# Altium schematic symbol library jlcpcb_2025_04_capacitors_extended_0603.schlib: 3668 symbols (part 19 of 20)
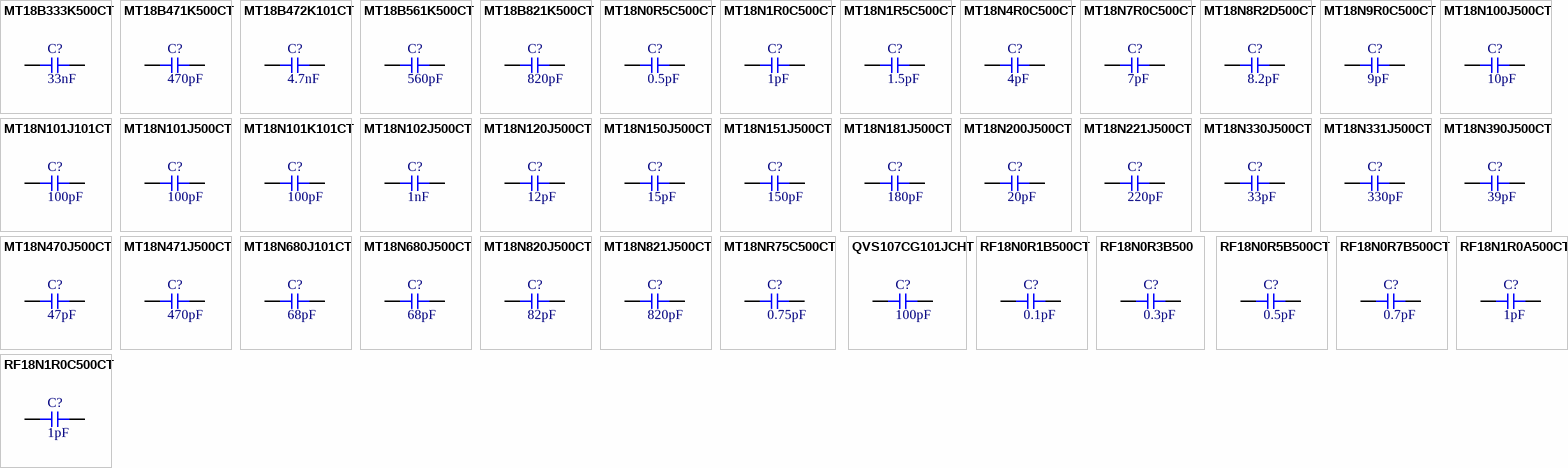
[diagram p109: symbols MT18B333K500CT to RF18N1R0C500CT]

## MT18N0R5C500CT
designator C?  Capacitance: 0.5pF  (hidden comment: *)
Capacitor, Ceramic (MLCC), 0.5pF, 50V, NP0, SMD 0603; Manufacturer: Walsin Tech Corp; Manufacturer Part Number: MT18N0R5C500CT; Package Size: 0603; JLCPCB Basic Part: No; JLCPCB Part Number: C908514; Supplier 1: LCSC; Category: Capacitors - MLCC; Supplier Part Number 1: C908514; Voltage Rating: 50V; Temperature Coefficient: NP0; RoHS: Yes; ComponentLink1Description: Datasheet; ComponentLink1URL: https://wmsc.lcsc.com/wmsc/upload/file/pdf/v2/lcsc/2304140030_Walsin-Tech-Corp-MT18N0R5C500CT_C908514.pdf; ComponentLink2Description: JLCPCB Part URL; ComponentLink2URL: https://jlcpcb.com/partdetail/C908514; ComponentLink3Description: LCSC Part URL; ComponentLink3URL: https://lcsc.com/product-detail/Multilayer-Ceramic-Capacitors-MLCC---SMD-SMT_Walsin-Tech-Corp-Walsin-Tech-Corp-MT18N0R5C500CT_C908514.html
footprint CAP-0603 (0603 (1608M) Capacitor)
pins: 1, 2

## MT18N1R0C500CT
designator C?  Capacitance: 1pF  (hidden comment: *)
Capacitor, Ceramic (MLCC), 1pF, 50V, NP0, SMD 0603; Manufacturer: Walsin Tech Corp; Manufacturer Part Number: MT18N1R0C500CT; Package Size: 0603; JLCPCB Basic Part: No; JLCPCB Part Number: C335541; Supplier 1: LCSC; Category: Capacitors - MLCC; Supplier Part Number 1: C335541; Voltage Rating: 50V; Temperature Coefficient: NP0; RoHS: Yes; ComponentLink1Description: Datasheet; ComponentLink1URL: https://wmsc.lcsc.com/wmsc/upload/file/pdf/v2/lcsc/2304140030_Walsin-Tech-Corp-MT18N1R0C500CT_C335541.pdf; ComponentLink2Description: JLCPCB Part URL; ComponentLink2URL: https://jlcpcb.com/partdetail/C335541; ComponentLink3Description: LCSC Part URL; ComponentLink3URL: https://lcsc.com/product-detail/Multilayer-Ceramic-Capacitors-MLCC---SMD-SMT_Walsin-Tech-Corp-Walsin-Tech-Corp-MT18N1R0C500CT_C335541.html
footprint CAP-0603 (0603 (1608M) Capacitor)
pins: 1, 2

## MT18N1R5C500CT
designator C?  Capacitance: 1.5pF  (hidden comment: *)
Capacitor, Ceramic (MLCC), 1.5pF, 50V, NP0, SMD 0603; Manufacturer: Walsin Tech Corp; Manufacturer Part Number: MT18N1R5C500CT; Package Size: 0603; JLCPCB Basic Part: No; JLCPCB Part Number: C908503; Supplier 1: LCSC; Category: Capacitors - MLCC; Supplier Part Number 1: C908503; Voltage Rating: 50V; Temperature Coefficient: NP0; RoHS: Yes; ComponentLink1Description: Datasheet; ComponentLink1URL: https://wmsc.lcsc.com/wmsc/upload/file/pdf/v2/lcsc/2304140030_Walsin-Tech-Corp-MT18N1R5C500CT_C908503.pdf; ComponentLink2Description: JLCPCB Part URL; ComponentLink2URL: https://jlcpcb.com/partdetail/C908503; ComponentLink3Description: LCSC Part URL; ComponentLink3URL: https://lcsc.com/product-detail/Multilayer-Ceramic-Capacitors-MLCC---SMD-SMT_Walsin-Tech-Corp-Walsin-Tech-Corp-MT18N1R5C500CT_C908503.html
footprint CAP-0603 (0603 (1608M) Capacitor)
pins: 1, 2

## MT18N4R0C500CT
designator C?  Capacitance: 4pF  (hidden comment: *)
Capacitor, Ceramic (MLCC), 4pF, 50V, NP0, SMD 0603; Manufacturer: Walsin Tech Corp; Manufacturer Part Number: MT18N4R0C500CT; Package Size: 0603; JLCPCB Basic Part: No; JLCPCB Part Number: C908501; Supplier 1: LCSC; Category: Capacitors - MLCC; Supplier Part Number 1: C908501; Voltage Rating: 50V; Temperature Coefficient: NP0; RoHS: Yes; ComponentLink1Description: Datasheet; ComponentLink1URL: https://wmsc.lcsc.com/wmsc/upload/file/pdf/v2/lcsc/2304140030_Walsin-Tech-Corp-MT18N4R0C500CT_C908501.pdf; ComponentLink2Description: JLCPCB Part URL; ComponentLink2URL: https://jlcpcb.com/partdetail/C908501; ComponentLink3Description: LCSC Part URL; ComponentLink3URL: https://lcsc.com/product-detail/Multilayer-Ceramic-Capacitors-MLCC---SMD-SMT_Walsin-Tech-Corp-Walsin-Tech-Corp-MT18N4R0C500CT_C908501.html
footprint CAP-0603 (0603 (1608M) Capacitor)
pins: 1, 2

## MT18N7R0C500CT
designator C?  Capacitance: 7pF  (hidden comment: *)
Capacitor, Ceramic (MLCC), 7pF, 50V, NP0, SMD 0603; Manufacturer: Walsin Tech Corp; Manufacturer Part Number: MT18N7R0C500CT; Package Size: 0603; JLCPCB Basic Part: No; JLCPCB Part Number: C908549; Supplier 1: LCSC; Category: Capacitors - MLCC; Supplier Part Number 1: C908549; Voltage Rating: 50V; Temperature Coefficient: NP0; RoHS: Yes; ComponentLink1Description: Datasheet; ComponentLink1URL: https://wmsc.lcsc.com/wmsc/upload/file/pdf/v2/lcsc/2304140030_Walsin-Tech-Corp-MT18N7R0C500CT_C908549.pdf; ComponentLink2Description: JLCPCB Part URL; ComponentLink2URL: https://jlcpcb.com/partdetail/C908549; ComponentLink3Description: LCSC Part URL; ComponentLink3URL: https://lcsc.com/product-detail/Multilayer-Ceramic-Capacitors-MLCC---SMD-SMT_Walsin-Tech-Corp-Walsin-Tech-Corp-MT18N7R0C500CT_C908549.html
footprint CAP-0603 (0603 (1608M) Capacitor)
pins: 1, 2

## MT18N8R2D500CT
designator C?  Capacitance: 8.2pF  (hidden comment: *)
Capacitor, Ceramic (MLCC), 8.2pF, 50V, NP0, SMD 0603; Manufacturer: Walsin Tech Corp; Manufacturer Part Number: MT18N8R2D500CT; Package Size: 0603; JLCPCB Basic Part: No; JLCPCB Part Number: C458972; Supplier 1: LCSC; Category: Capacitors - MLCC; Supplier Part Number 1: C458972; Voltage Rating: 50V; Temperature Coefficient: NP0; RoHS: Yes; ComponentLink1Description: Datasheet; ComponentLink1URL: https://wmsc.lcsc.com/wmsc/upload/file/pdf/v2/lcsc/2304140030_Walsin-Tech-Corp-MT18N8R2D500CT_C458972.pdf; ComponentLink2Description: JLCPCB Part URL; ComponentLink2URL: https://jlcpcb.com/partdetail/C458972; ComponentLink3Description: LCSC Part URL; ComponentLink3URL: https://lcsc.com/product-detail/Multilayer-Ceramic-Capacitors-MLCC---SMD-SMT_Walsin-Tech-Corp-Walsin-Tech-Corp-MT18N8R2D500CT_C458972.html
footprint CAP-0603 (0603 (1608M) Capacitor)
pins: 1, 2

## MT18N9R0C500CT
designator C?  Capacitance: 9pF  (hidden comment: *)
Capacitor, Ceramic (MLCC), 9pF, 50V, NP0, SMD 0603; Manufacturer: Walsin Tech Corp; Manufacturer Part Number: MT18N9R0C500CT; Package Size: 0603; JLCPCB Basic Part: No; JLCPCB Part Number: C908550; Supplier 1: LCSC; Category: Capacitors - MLCC; Supplier Part Number 1: C908550; Voltage Rating: 50V; Temperature Coefficient: NP0; RoHS: Yes; ComponentLink1Description: Datasheet; ComponentLink1URL: https://wmsc.lcsc.com/wmsc/upload/file/pdf/v2/lcsc/2010271908_Walsin-Tech-Corp-MT18N9R0C500CT_C908550.pdf; ComponentLink2Description: JLCPCB Part URL; ComponentLink2URL: https://jlcpcb.com/partdetail/C908550; ComponentLink3Description: LCSC Part URL; ComponentLink3URL: https://lcsc.com/product-detail/Multilayer-Ceramic-Capacitors-MLCC---SMD-SMT_Walsin-Tech-Corp-Walsin-Tech-Corp-MT18N9R0C500CT_C908550.html
footprint CAP-0603 (0603 (1608M) Capacitor)
pins: 1, 2

## MT18N100J500CT
designator C?  Capacitance: 10pF  (hidden comment: *)
Capacitor, Ceramic (MLCC), 10pF, ±5%, 50V, NP0, ±5%, SMD 0603; Manufacturer: Walsin Tech Corp; Manufacturer Part Number: MT18N100J500CT; Package Size: 0603; JLCPCB Basic Part: No; JLCPCB Part Number: C431817; Supplier 1: LCSC; Category: Capacitors - MLCC; Supplier Part Number 1: C431817; Tolerance: ±5%; Voltage Rating: 50V; Temperature Coefficient: NP0; RoHS: Yes; ComponentLink1Description: Datasheet; ComponentLink1URL: https://wmsc.lcsc.com/wmsc/upload/file/pdf/v2/lcsc/2304140030_Walsin-Tech-Corp-MT18N100J500CT_C431817.pdf; ComponentLink2Description: JLCPCB Part URL; ComponentLink2URL: https://jlcpcb.com/partdetail/C431817; ComponentLink3Description: LCSC Part URL; ComponentLink3URL: https://lcsc.com/product-detail/Multilayer-Ceramic-Capacitors-MLCC---SMD-SMT_Walsin-Tech-Corp-Walsin-Tech-Corp-MT18N100J500CT_C431817.html
footprint CAP-0603 (0603 (1608M) Capacitor)
pins: 1, 2

## MT18N101J101CT
designator C?  Capacitance: 100pF  (hidden comment: *)
Capacitor, Ceramic (MLCC), 100pF, ±5%, 100V, NP0, ±5%, SMD 0603; Manufacturer: Walsin Tech Corp; Manufacturer Part Number: MT18N101J101CT; Package Size: 0603; JLCPCB Basic Part: No; JLCPCB Part Number: C323564; Supplier 1: LCSC; Category: Capacitors - MLCC; Supplier Part Number 1: C323564; Tolerance: ±5%; Voltage Rating: 100V; Temperature Coefficient: NP0; RoHS: Yes; ComponentLink1Description: Datasheet; ComponentLink1URL: https://wmsc.lcsc.com/wmsc/upload/file/pdf/v2/lcsc/2304140030_Walsin-Tech-Corp-MT18N101J101CT_C323564.pdf; ComponentLink2Description: JLCPCB Part URL; ComponentLink2URL: https://jlcpcb.com/partdetail/C323564; ComponentLink3Description: LCSC Part URL; ComponentLink3URL: https://lcsc.com/product-detail/Multilayer-Ceramic-Capacitors-MLCC---SMD-SMT_Walsin-Tech-Corp-Walsin-Tech-Corp-MT18N101J101CT_C323564.html
footprint CAP-0603 (0603 (1608M) Capacitor)
pins: 1, 2

## MT18N101J500CT
designator C?  Capacitance: 100pF  (hidden comment: *)
Capacitor, Ceramic (MLCC), 100pF, ±5%, 50V, NP0, ±5%, SMD 0603; Manufacturer: Walsin Tech Corp; Manufacturer Part Number: MT18N101J500CT; Package Size: 0603; JLCPCB Basic Part: No; JLCPCB Part Number: C323563; Supplier 1: LCSC; Category: Capacitors - MLCC; Supplier Part Number 1: C323563; Tolerance: ±5%; Voltage Rating: 50V; Temperature Coefficient: NP0; RoHS: Yes; ComponentLink1Description: Datasheet; ComponentLink1URL: https://wmsc.lcsc.com/wmsc/upload/file/pdf/v2/lcsc/2304140030_Walsin-Tech-Corp-MT18N101J500CT_C323563.pdf; ComponentLink2Description: JLCPCB Part URL; ComponentLink2URL: https://jlcpcb.com/partdetail/C323563; ComponentLink3Description: LCSC Part URL; ComponentLink3URL: https://lcsc.com/product-detail/Multilayer-Ceramic-Capacitors-MLCC---SMD-SMT_Walsin-Tech-Corp-Walsin-Tech-Corp-MT18N101J500CT_C323563.html
footprint CAP-0603 (0603 (1608M) Capacitor)
pins: 1, 2

## MT18N101K101CT
designator C?  Capacitance: 100pF  (hidden comment: *)
Capacitor, Ceramic (MLCC), 100pF, NP0, SMD 0603; Manufacturer: Walsin Tech Corp; Manufacturer Part Number: MT18N101K101CT; Package Size: 0603; JLCPCB Basic Part: No; JLCPCB Part Number: C4354964; Supplier 1: LCSC; Category: Capacitors - MLCC; Supplier Part Number 1: C4354964; Temperature Coefficient: NP0; RoHS: Yes; ComponentLink1Description: Datasheet; ComponentLink1URL: https://wmsc.lcsc.com/wmsc/upload/file/pdf/v2/lcsc/2207131800_Walsin-Tech-Corp-MT18N101K101CT_C4354964.pdf; ComponentLink2Description: JLCPCB Part URL; ComponentLink2URL: https://jlcpcb.com/partdetail/C4354964; ComponentLink3Description: LCSC Part URL; ComponentLink3URL: https://lcsc.com/product-detail/Multilayer-Ceramic-Capacitors-MLCC---SMD-SMT_Walsin-Tech-Corp-Walsin-Tech-Corp-MT18N101K101CT_C4354964.html
footprint CAP-0603 (0603 (1608M) Capacitor)
pins: 1, 2

## MT18N102J500CT
designator C?  Capacitance: 1nF  (hidden comment: *)
Capacitor, Ceramic (MLCC), 1nF, ±5%, 50V, NP0, ±5%, SMD 0603; Manufacturer: Walsin Tech Corp; Manufacturer Part Number: MT18N102J500CT; Package Size: 0603; JLCPCB Basic Part: No; JLCPCB Part Number: C458965; Supplier 1: LCSC; Category: Capacitors - MLCC; Supplier Part Number 1: C458965; Tolerance: ±5%; Voltage Rating: 50V; Temperature Coefficient: NP0; RoHS: Yes; ComponentLink1Description: Datasheet; ComponentLink1URL: https://wmsc.lcsc.com/wmsc/upload/file/pdf/v2/lcsc/2304140030_Walsin-Tech-Corp-MT18N102J500CT_C458965.pdf; ComponentLink2Description: JLCPCB Part URL; ComponentLink2URL: https://jlcpcb.com/partdetail/C458965; ComponentLink3Description: LCSC Part URL; ComponentLink3URL: https://lcsc.com/product-detail/Multilayer-Ceramic-Capacitors-MLCC---SMD-SMT_Walsin-Tech-Corp-Walsin-Tech-Corp-MT18N102J500CT_C458965.html
footprint CAP-0603 (0603 (1608M) Capacitor)
pins: 1, 2

## MT18N120J500CT
designator C?  Capacitance: 12pF  (hidden comment: *)
Capacitor, Ceramic (MLCC), 12pF, ±5%, 50V, NP0, ±5%, SMD 0603; Manufacturer: Walsin Tech Corp; Manufacturer Part Number: MT18N120J500CT; Package Size: 0603; JLCPCB Basic Part: No; JLCPCB Part Number: C335540; Supplier 1: LCSC; Category: Capacitors - MLCC; Supplier Part Number 1: C335540; Tolerance: ±5%; Voltage Rating: 50V; Temperature Coefficient: NP0; RoHS: Yes; ComponentLink1Description: Datasheet; ComponentLink1URL: https://wmsc.lcsc.com/wmsc/upload/file/pdf/v2/lcsc/2304140030_Walsin-Tech-Corp-MT18N120J500CT_C335540.pdf; ComponentLink2Description: JLCPCB Part URL; ComponentLink2URL: https://jlcpcb.com/partdetail/C335540; ComponentLink3Description: LCSC Part URL; ComponentLink3URL: https://lcsc.com/product-detail/Multilayer-Ceramic-Capacitors-MLCC---SMD-SMT_Walsin-Tech-Corp-Walsin-Tech-Corp-MT18N120J500CT_C335540.html
footprint CAP-0603 (0603 (1608M) Capacitor)
pins: 1, 2

## MT18N150J500CT
designator C?  Capacitance: 15pF  (hidden comment: *)
Capacitor, Ceramic (MLCC), 15pF, ±5%, 50V, NP0, ±5%, SMD 0603; Manufacturer: Walsin Tech Corp; Manufacturer Part Number: MT18N150J500CT; Package Size: 0603; JLCPCB Basic Part: No; JLCPCB Part Number: C323562; Supplier 1: LCSC; Category: Capacitors - MLCC; Supplier Part Number 1: C323562; Tolerance: ±5%; Voltage Rating: 50V; Temperature Coefficient: NP0; RoHS: Yes; ComponentLink1Description: Datasheet; ComponentLink1URL: https://wmsc.lcsc.com/wmsc/upload/file/pdf/v2/lcsc/2304140030_Walsin-Tech-Corp-MT18N150J500CT_C323562.pdf; ComponentLink2Description: JLCPCB Part URL; ComponentLink2URL: https://jlcpcb.com/partdetail/C323562; ComponentLink3Description: LCSC Part URL; ComponentLink3URL: https://lcsc.com/product-detail/Multilayer-Ceramic-Capacitors-MLCC---SMD-SMT_Walsin-Tech-Corp-Walsin-Tech-Corp-MT18N150J500CT_C323562.html
footprint CAP-0603 (0603 (1608M) Capacitor)
pins: 1, 2

## MT18N151J500CT
designator C?  Capacitance: 150pF  (hidden comment: *)
Capacitor, Ceramic (MLCC), 150pF, ±5%, 50V, NP0, ±5%, SMD 0603; Manufacturer: Walsin Tech Corp; Manufacturer Part Number: MT18N151J500CT; Package Size: 0603; JLCPCB Basic Part: No; JLCPCB Part Number: C323561; Supplier 1: LCSC; Category: Capacitors - MLCC; Supplier Part Number 1: C323561; Tolerance: ±5%; Voltage Rating: 50V; Temperature Coefficient: NP0; RoHS: Yes; ComponentLink1Description: Datasheet; ComponentLink1URL: https://wmsc.lcsc.com/wmsc/upload/file/pdf/v2/lcsc/2304140030_Walsin-Tech-Corp-MT18N151J500CT_C323561.pdf; ComponentLink2Description: JLCPCB Part URL; ComponentLink2URL: https://jlcpcb.com/partdetail/C323561; ComponentLink3Description: LCSC Part URL; ComponentLink3URL: https://lcsc.com/product-detail/Multilayer-Ceramic-Capacitors-MLCC---SMD-SMT_Walsin-Tech-Corp-Walsin-Tech-Corp-MT18N151J500CT_C323561.html
footprint CAP-0603 (0603 (1608M) Capacitor)
pins: 1, 2

## MT18N181J500CT
designator C?  Capacitance: 180pF  (hidden comment: *)
Capacitor, Ceramic (MLCC), 180pF, ±5%, 50V, NP0, ±5%, SMD 0603; Manufacturer: Walsin Tech Corp; Manufacturer Part Number: MT18N181J500CT; Package Size: 0603; JLCPCB Basic Part: No; JLCPCB Part Number: C458966; Supplier 1: LCSC; Category: Capacitors - MLCC; Supplier Part Number 1: C458966; Tolerance: ±5%; Voltage Rating: 50V; Temperature Coefficient: NP0; RoHS: Yes; ComponentLink1Description: Datasheet; ComponentLink1URL: https://wmsc.lcsc.com/wmsc/upload/file/pdf/v2/lcsc/2304140030_Walsin-Tech-Corp-MT18N181J500CT_C458966.pdf; ComponentLink2Description: JLCPCB Part URL; ComponentLink2URL: https://jlcpcb.com/partdetail/C458966; ComponentLink3Description: LCSC Part URL; ComponentLink3URL: https://lcsc.com/product-detail/Multilayer-Ceramic-Capacitors-MLCC---SMD-SMT_Walsin-Tech-Corp-Walsin-Tech-Corp-MT18N181J500CT_C458966.html
footprint CAP-0603 (0603 (1608M) Capacitor)
pins: 1, 2

## MT18N200J500CT
designator C?  Capacitance: 20pF  (hidden comment: *)
Capacitor, Ceramic (MLCC), 20pF, ±5%, 50V, NP0, ±5%, SMD 0603; Manufacturer: Walsin Tech Corp; Manufacturer Part Number: MT18N200J500CT; Package Size: 0603; JLCPCB Basic Part: No; JLCPCB Part Number: C458967; Supplier 1: LCSC; Category: Capacitors - MLCC; Supplier Part Number 1: C458967; Tolerance: ±5%; Voltage Rating: 50V; Temperature Coefficient: NP0; RoHS: Yes; ComponentLink1Description: Datasheet; ComponentLink1URL: https://wmsc.lcsc.com/wmsc/upload/file/pdf/v2/lcsc/2304140030_Walsin-Tech-Corp-MT18N200J500CT_C458967.pdf; ComponentLink2Description: JLCPCB Part URL; ComponentLink2URL: https://jlcpcb.com/partdetail/C458967; ComponentLink3Description: LCSC Part URL; ComponentLink3URL: https://lcsc.com/product-detail/Multilayer-Ceramic-Capacitors-MLCC---SMD-SMT_Walsin-Tech-Corp-Walsin-Tech-Corp-MT18N200J500CT_C458967.html
footprint CAP-0603 (0603 (1608M) Capacitor)
pins: 1, 2

## MT18N221J500CT
designator C?  Capacitance: 220pF  (hidden comment: *)
Capacitor, Ceramic (MLCC), 220pF, ±5%, 50V, NP0, ±5%, SMD 0603; Manufacturer: Walsin Tech Corp; Manufacturer Part Number: MT18N221J500CT; Package Size: 0603; JLCPCB Basic Part: No; JLCPCB Part Number: C458968; Supplier 1: LCSC; Category: Capacitors - MLCC; Supplier Part Number 1: C458968; Tolerance: ±5%; Voltage Rating: 50V; Temperature Coefficient: NP0; RoHS: Yes; ComponentLink1Description: Datasheet; ComponentLink1URL: https://wmsc.lcsc.com/wmsc/upload/file/pdf/v2/lcsc/2304140030_Walsin-Tech-Corp-MT18N221J500CT_C458968.pdf; ComponentLink2Description: JLCPCB Part URL; ComponentLink2URL: https://jlcpcb.com/partdetail/C458968; ComponentLink3Description: LCSC Part URL; ComponentLink3URL: https://lcsc.com/product-detail/Multilayer-Ceramic-Capacitors-MLCC---SMD-SMT_Walsin-Tech-Corp-Walsin-Tech-Corp-MT18N221J500CT_C458968.html
footprint CAP-0603 (0603 (1608M) Capacitor)
pins: 1, 2

## MT18N330J500CT
designator C?  Capacitance: 33pF  (hidden comment: *)
Capacitor, Ceramic (MLCC), 33pF, ±5%, 50V, NP0, ±5%, SMD 0603; Manufacturer: Walsin Tech Corp; Manufacturer Part Number: MT18N330J500CT; Package Size: 0603; JLCPCB Basic Part: No; JLCPCB Part Number: C323560; Supplier 1: LCSC; Category: Capacitors - MLCC; Supplier Part Number 1: C323560; Tolerance: ±5%; Voltage Rating: 50V; Temperature Coefficient: NP0; RoHS: Yes; ComponentLink1Description: Datasheet; ComponentLink1URL: https://wmsc.lcsc.com/wmsc/upload/file/pdf/v2/lcsc/2304140030_Walsin-Tech-Corp-MT18N330J500CT_C323560.pdf; ComponentLink2Description: JLCPCB Part URL; ComponentLink2URL: https://jlcpcb.com/partdetail/C323560; ComponentLink3Description: LCSC Part URL; ComponentLink3URL: https://lcsc.com/product-detail/Multilayer-Ceramic-Capacitors-MLCC---SMD-SMT_Walsin-Tech-Corp-Walsin-Tech-Corp-MT18N330J500CT_C323560.html
footprint CAP-0603 (0603 (1608M) Capacitor)
pins: 1, 2

## MT18N331J500CT
designator C?  Capacitance: 330pF  (hidden comment: *)
Capacitor, Ceramic (MLCC), 330pF, ±5%, 50V, NP0, ±5%, SMD 0603; Manufacturer: Walsin Tech Corp; Manufacturer Part Number: MT18N331J500CT; Package Size: 0603; JLCPCB Basic Part: No; JLCPCB Part Number: C335542; Supplier 1: LCSC; Category: Capacitors - MLCC; Supplier Part Number 1: C335542; Tolerance: ±5%; Voltage Rating: 50V; Temperature Coefficient: NP0; RoHS: Yes; ComponentLink1Description: Datasheet; ComponentLink1URL: https://wmsc.lcsc.com/wmsc/upload/file/pdf/v2/lcsc/2304140030_Walsin-Tech-Corp-MT18N331J500CT_C335542.pdf; ComponentLink2Description: JLCPCB Part URL; ComponentLink2URL: https://jlcpcb.com/partdetail/C335542; ComponentLink3Description: LCSC Part URL; ComponentLink3URL: https://lcsc.com/product-detail/Multilayer-Ceramic-Capacitors-MLCC---SMD-SMT_Walsin-Tech-Corp-Walsin-Tech-Corp-MT18N331J500CT_C335542.html
footprint CAP-0603 (0603 (1608M) Capacitor)
pins: 1, 2

## MT18N390J500CT
designator C?  Capacitance: 39pF  (hidden comment: *)
Capacitor, Ceramic (MLCC), 39pF, ±5%, 50V, NP0, ±5%, SMD 0603; Manufacturer: Walsin Tech Corp; Manufacturer Part Number: MT18N390J500CT; Package Size: 0603; JLCPCB Basic Part: No; JLCPCB Part Number: C908518; Supplier 1: LCSC; Category: Capacitors - MLCC; Supplier Part Number 1: C908518; Tolerance: ±5%; Voltage Rating: 50V; Temperature Coefficient: NP0; RoHS: Yes; ComponentLink1Description: Datasheet; ComponentLink1URL: https://wmsc.lcsc.com/wmsc/upload/file/pdf/v2/lcsc/2304140030_Walsin-Tech-Corp-MT18N390J500CT_C908518.pdf; ComponentLink2Description: JLCPCB Part URL; ComponentLink2URL: https://jlcpcb.com/partdetail/C908518; ComponentLink3Description: LCSC Part URL; ComponentLink3URL: https://lcsc.com/product-detail/Multilayer-Ceramic-Capacitors-MLCC---SMD-SMT_Walsin-Tech-Corp-Walsin-Tech-Corp-MT18N390J500CT_C908518.html
footprint CAP-0603 (0603 (1608M) Capacitor)
pins: 1, 2

## MT18N470J500CT
designator C?  Capacitance: 47pF  (hidden comment: *)
Capacitor, Ceramic (MLCC), 47pF, ±5%, 50V, NP0, ±5%, SMD 0603; Manufacturer: Walsin Tech Corp; Manufacturer Part Number: MT18N470J500CT; Package Size: 0603; JLCPCB Basic Part: No; JLCPCB Part Number: C323559; Supplier 1: LCSC; Category: Capacitors - MLCC; Supplier Part Number 1: C323559; Tolerance: ±5%; Voltage Rating: 50V; Temperature Coefficient: NP0; RoHS: Yes; ComponentLink1Description: Datasheet; ComponentLink1URL: https://wmsc.lcsc.com/wmsc/upload/file/pdf/v2/lcsc/2304140030_Walsin-Tech-Corp-MT18N470J500CT_C323559.pdf; ComponentLink2Description: JLCPCB Part URL; ComponentLink2URL: https://jlcpcb.com/partdetail/C323559; ComponentLink3Description: LCSC Part URL; ComponentLink3URL: https://lcsc.com/product-detail/Multilayer-Ceramic-Capacitors-MLCC---SMD-SMT_Walsin-Tech-Corp-Walsin-Tech-Corp-MT18N470J500CT_C323559.html
footprint CAP-0603 (0603 (1608M) Capacitor)
pins: 1, 2

## MT18N471J500CT
designator C?  Capacitance: 470pF  (hidden comment: *)
Capacitor, Ceramic (MLCC), 470pF, ±5%, 50V, NP0, ±5%, SMD 0603; Manufacturer: Walsin Tech Corp; Manufacturer Part Number: MT18N471J500CT; Package Size: 0603; JLCPCB Basic Part: No; JLCPCB Part Number: C458969; Supplier 1: LCSC; Category: Capacitors - MLCC; Supplier Part Number 1: C458969; Tolerance: ±5%; Voltage Rating: 50V; Temperature Coefficient: NP0; RoHS: Yes; ComponentLink1Description: Datasheet; ComponentLink1URL: https://wmsc.lcsc.com/wmsc/upload/file/pdf/v2/lcsc/2304140030_Walsin-Tech-Corp-MT18N471J500CT_C458969.pdf; ComponentLink2Description: JLCPCB Part URL; ComponentLink2URL: https://jlcpcb.com/partdetail/C458969; ComponentLink3Description: LCSC Part URL; ComponentLink3URL: https://lcsc.com/product-detail/Multilayer-Ceramic-Capacitors-MLCC---SMD-SMT_Walsin-Tech-Corp-Walsin-Tech-Corp-MT18N471J500CT_C458969.html
footprint CAP-0603 (0603 (1608M) Capacitor)
pins: 1, 2

## MT18N680J101CT
designator C?  Capacitance: 68pF  (hidden comment: *)
Capacitor, Ceramic (MLCC), 68pF, 100V, NP0, SMD 0603; Manufacturer: Walsin Tech Corp; Manufacturer Part Number: MT18N680J101CT; Package Size: 0603; JLCPCB Basic Part: No; JLCPCB Part Number: C2918633; Supplier 1: LCSC; Category: Capacitors - MLCC; Supplier Part Number 1: C2918633; Voltage Rating: 100V; Temperature Coefficient: NP0; RoHS: Yes; ComponentLink1Description: Datasheet; ComponentLink1URL: https://wmsc.lcsc.com/wmsc/upload/file/pdf/v2/lcsc/2111171830_Walsin-Tech-Corp-MT18N680J101CT_C2918633.pdf; ComponentLink2Description: JLCPCB Part URL; ComponentLink2URL: https://jlcpcb.com/partdetail/C2918633; ComponentLink3Description: LCSC Part URL; ComponentLink3URL: https://lcsc.com/product-detail/Multilayer-Ceramic-Capacitors-MLCC---SMD-SMT_Walsin-Tech-Corp-Walsin-Tech-Corp-MT18N680J101CT_C2918633.html
footprint CAP-0603 (0603 (1608M) Capacitor)
pins: 1, 2

## MT18N680J500CT
designator C?  Capacitance: 68pF  (hidden comment: *)
Capacitor, Ceramic (MLCC), 68pF, ±5%, 50V, NP0, ±5%, SMD 0603; Manufacturer: Walsin Tech Corp; Manufacturer Part Number: MT18N680J500CT; Package Size: 0603; JLCPCB Basic Part: No; JLCPCB Part Number: C458970; Supplier 1: LCSC; Category: Capacitors - MLCC; Supplier Part Number 1: C458970; Tolerance: ±5%; Voltage Rating: 50V; Temperature Coefficient: NP0; RoHS: Yes; ComponentLink1Description: Datasheet; ComponentLink1URL: https://wmsc.lcsc.com/wmsc/upload/file/pdf/v2/lcsc/2304140030_Walsin-Tech-Corp-MT18N680J500CT_C458970.pdf; ComponentLink2Description: JLCPCB Part URL; ComponentLink2URL: https://jlcpcb.com/partdetail/C458970; ComponentLink3Description: LCSC Part URL; ComponentLink3URL: https://lcsc.com/product-detail/Multilayer-Ceramic-Capacitors-MLCC---SMD-SMT_Walsin-Tech-Corp-Walsin-Tech-Corp-MT18N680J500CT_C458970.html
footprint CAP-0603 (0603 (1608M) Capacitor)
pins: 1, 2

## MT18N820J500CT
designator C?  Capacitance: 82pF  (hidden comment: *)
Capacitor, Ceramic (MLCC), 82pF, ±5%, 50V, NP0, ±5%, SMD 0603; Manufacturer: Walsin Tech Corp; Manufacturer Part Number: MT18N820J500CT; Package Size: 0603; JLCPCB Basic Part: No; JLCPCB Part Number: C458971; Supplier 1: LCSC; Category: Capacitors - MLCC; Supplier Part Number 1: C458971; Tolerance: ±5%; Voltage Rating: 50V; Temperature Coefficient: NP0; RoHS: Yes; ComponentLink1Description: Datasheet; ComponentLink1URL: https://wmsc.lcsc.com/wmsc/upload/file/pdf/v2/lcsc/2304140030_Walsin-Tech-Corp-MT18N820J500CT_C458971.pdf; ComponentLink2Description: JLCPCB Part URL; ComponentLink2URL: https://jlcpcb.com/partdetail/C458971; ComponentLink3Description: LCSC Part URL; ComponentLink3URL: https://lcsc.com/product-detail/Multilayer-Ceramic-Capacitors-MLCC---SMD-SMT_Walsin-Tech-Corp-Walsin-Tech-Corp-MT18N820J500CT_C458971.html
footprint CAP-0603 (0603 (1608M) Capacitor)
pins: 1, 2

## MT18N821J500CT
designator C?  Capacitance: 820pF  (hidden comment: *)
Capacitor, Ceramic (MLCC), 820pF, ±5%, 50V, NP0, ±5%, SMD 0603; Manufacturer: Walsin Tech Corp; Manufacturer Part Number: MT18N821J500CT; Package Size: 0603; JLCPCB Basic Part: No; JLCPCB Part Number: C908542; Supplier 1: LCSC; Category: Capacitors - MLCC; Supplier Part Number 1: C908542; Tolerance: ±5%; Voltage Rating: 50V; Temperature Coefficient: NP0; RoHS: Yes; ComponentLink1Description: Datasheet; ComponentLink1URL: https://wmsc.lcsc.com/wmsc/upload/file/pdf/v2/lcsc/2304140030_Walsin-Tech-Corp-MT18N821J500CT_C908542.pdf; ComponentLink2Description: JLCPCB Part URL; ComponentLink2URL: https://jlcpcb.com/partdetail/C908542; ComponentLink3Description: LCSC Part URL; ComponentLink3URL: https://lcsc.com/product-detail/Multilayer-Ceramic-Capacitors-MLCC---SMD-SMT_Walsin-Tech-Corp-Walsin-Tech-Corp-MT18N821J500CT_C908542.html
footprint CAP-0603 (0603 (1608M) Capacitor)
pins: 1, 2

## MT18NR75C500CT
designator C?  Capacitance: 0.75pF  (hidden comment: *)
Capacitor, Ceramic (MLCC), 0.75pF, 50V, NP0, SMD 0603; Manufacturer: Walsin Tech Corp; Manufacturer Part Number: MT18NR75C500CT; Package Size: 0603; JLCPCB Basic Part: No; JLCPCB Part Number: C908500; Supplier 1: LCSC; Category: Capacitors - MLCC; Supplier Part Number 1: C908500; Voltage Rating: 50V; Temperature Coefficient: NP0; RoHS: Yes; ComponentLink1Description: Datasheet; ComponentLink1URL: https://wmsc.lcsc.com/wmsc/upload/file/pdf/v2/lcsc/2304140030_Walsin-Tech-Corp-MT18NR75C500CT_C908500.pdf; ComponentLink2Description: JLCPCB Part URL; ComponentLink2URL: https://jlcpcb.com/partdetail/C908500; ComponentLink3Description: LCSC Part URL; ComponentLink3URL: https://lcsc.com/product-detail/Multilayer-Ceramic-Capacitors-MLCC---SMD-SMT_Walsin-Tech-Corp-Walsin-Tech-Corp-MT18NR75C500CT_C908500.html
footprint CAP-0603 (0603 (1608M) Capacitor)
pins: 1, 2

## QVS107CG101JCHT
designator C?  Capacitance: 100pF  (hidden comment: *)
Capacitor, Ceramic (MLCC), 100pF, ±5%, 250V, C0G, ±5%, SMD 0603; Manufacturer: Taiyo Yuden; Manufacturer Part Number: QVS107CG101JCHT; Package Size: 0603; JLCPCB Basic Part: No; JLCPCB Part Number: C2174972; Supplier 1: LCSC; Category: Capacitors - MLCC; Supplier Part Number 1: C2174972; Tolerance: ±5%; Voltage Rating: 250V; Temperature Coefficient: C0G; RoHS: Yes; ComponentLink1Description: Datasheet; ComponentLink1URL: https://wmsc.lcsc.com/wmsc/upload/file/pdf/v2/lcsc/2211282000_Taiyo-Yuden-QVS107CG101JCHT_C2174972.pdf; ComponentLink2Description: JLCPCB Part URL; ComponentLink2URL: https://jlcpcb.com/partdetail/C2174972; ComponentLink3Description: LCSC Part URL; ComponentLink3URL: https://lcsc.com/product-detail/Multilayer-Ceramic-Capacitors-MLCC---SMD-SMT_Taiyo-Yuden-Taiyo-Yuden-QVS107CG101JCHT_C2174972.html
footprint CAP-0603 (0603 (1608M) Capacitor)
pins: 1, 2

## RF18N0R1B500CT
designator C?  Capacitance: 0.1pF  (hidden comment: *)
Capacitor, Ceramic (MLCC), 0.1pF, 50V, NP0, SMD 0603; Manufacturer: Walsin Tech Corp; Manufacturer Part Number: RF18N0R1B500CT; Package Size: 0603; JLCPCB Basic Part: No; JLCPCB Part Number: C304680; Supplier 1: LCSC; Category: Capacitors - MLCC; Supplier Part Number 1: C304680; Voltage Rating: 50V; Temperature Coefficient: NP0; RoHS: Yes; ComponentLink1Description: Datasheet; ComponentLink1URL: https://wmsc.lcsc.com/wmsc/upload/file/pdf/v2/lcsc/2304140030_Walsin-Tech-Corp-RF18N0R1B500CT_C304680.pdf; ComponentLink2Description: JLCPCB Part URL; ComponentLink2URL: https://jlcpcb.com/partdetail/C304680; ComponentLink3Description: LCSC Part URL; ComponentLink3URL: https://lcsc.com/product-detail/Multilayer-Ceramic-Capacitors-MLCC---SMD-SMT_Walsin-Tech-Corp-Walsin-Tech-Corp-RF18N0R1B500CT_C304680.html
footprint CAP-0603 (0603 (1608M) Capacitor)
pins: 1, 2

## RF18N0R3B500
designator C?  Capacitance: 0.3pF  (hidden comment: *)
Capacitor, Ceramic (MLCC), 0.3pF, 50V, NP0, SMD 0603; Manufacturer: Walsin Tech Corp; Manufacturer Part Number: RF18N0R3B500; Package Size: 0603; JLCPCB Basic Part: No; JLCPCB Part Number: C172843; Supplier 1: LCSC; Category: Capacitors - MLCC; Supplier Part Number 1: C172843; Voltage Rating: 50V; Temperature Coefficient: NP0; RoHS: Yes; ComponentLink1Description: Datasheet; ComponentLink1URL: https://wmsc.lcsc.com/wmsc/upload/file/pdf/v2/lcsc/2304140030_Walsin-Tech-Corp-RF18N0R3B500_C172843.pdf; ComponentLink2Description: JLCPCB Part URL; ComponentLink2URL: https://jlcpcb.com/partdetail/C172843; ComponentLink3Description: LCSC Part URL; ComponentLink3URL: https://lcsc.com/product-detail/Multilayer-Ceramic-Capacitors-MLCC---SMD-SMT_Walsin-Tech-Corp-Walsin-Tech-Corp-RF18N0R3B500_C172843.html
footprint CAP-0603 (0603 (1608M) Capacitor)
pins: 1, 2

## RF18N0R5B500CT
designator C?  Capacitance: 0.5pF  (hidden comment: *)
Capacitor, Ceramic (MLCC), 0.5pF, 50V, NP0, SMD 0603; Manufacturer: Walsin Tech Corp; Manufacturer Part Number: RF18N0R5B500CT; Package Size: 0603; JLCPCB Basic Part: No; JLCPCB Part Number: C172863; Supplier 1: LCSC; Category: Capacitors - MLCC; Supplier Part Number 1: C172863; Voltage Rating: 50V; Temperature Coefficient: NP0; RoHS: Yes; ComponentLink1Description: Datasheet; ComponentLink1URL: https://wmsc.lcsc.com/wmsc/upload/file/pdf/v2/lcsc/2304140030_Walsin-Tech-Corp-RF18N0R5B500CT_C172863.pdf; ComponentLink2Description: JLCPCB Part URL; ComponentLink2URL: https://jlcpcb.com/partdetail/C172863; ComponentLink3Description: LCSC Part URL; ComponentLink3URL: https://lcsc.com/product-detail/Multilayer-Ceramic-Capacitors-MLCC---SMD-SMT_Walsin-Tech-Corp-Walsin-Tech-Corp-RF18N0R5B500CT_C172863.html
footprint CAP-0603 (0603 (1608M) Capacitor)
pins: 1, 2

## RF18N0R7B500CT
designator C?  Capacitance: 0.7pF  (hidden comment: *)
Capacitor, Ceramic (MLCC), 0.7pF, 50V, NP0, SMD 0603; Manufacturer: Walsin Tech Corp; Manufacturer Part Number: RF18N0R7B500CT; Package Size: 0603; JLCPCB Basic Part: No; JLCPCB Part Number: C2909409; Supplier 1: LCSC; Category: Capacitors - MLCC; Supplier Part Number 1: C2909409; Voltage Rating: 50V; Temperature Coefficient: NP0; RoHS: Yes; ComponentLink1Description: Datasheet; ComponentLink1URL: https://wmsc.lcsc.com/wmsc/upload/file/pdf/v2/lcsc/2110281730_Walsin-Tech-Corp-RF18N0R7B500CT_C2909409.pdf; ComponentLink2Description: JLCPCB Part URL; ComponentLink2URL: https://jlcpcb.com/partdetail/C2909409; ComponentLink3Description: LCSC Part URL; ComponentLink3URL: https://lcsc.com/product-detail/Multilayer-Ceramic-Capacitors-MLCC---SMD-SMT_Walsin-Tech-Corp-Walsin-Tech-Corp-RF18N0R7B500CT_C2909409.html
footprint CAP-0603 (0603 (1608M) Capacitor)
pins: 1, 2

## RF18N1R0A500CT
designator C?  Capacitance: 1pF  (hidden comment: *)
Capacitor, Ceramic (MLCC), 1pF, 50V, NP0, SMD 0603; Manufacturer: Walsin Tech Corp; Manufacturer Part Number: RF18N1R0A500CT; Package Size: 0603; JLCPCB Basic Part: No; JLCPCB Part Number: C525512; Supplier 1: LCSC; Category: Capacitors - MLCC; Supplier Part Number 1: C525512; Voltage Rating: 50V; Temperature Coefficient: NP0; RoHS: Yes; ComponentLink1Description: Datasheet; ComponentLink1URL: https://wmsc.lcsc.com/wmsc/upload/file/pdf/v2/lcsc/2304140030_Walsin-Tech-Corp-RF18N1R0A500CT_C525512.pdf; ComponentLink2Description: JLCPCB Part URL; ComponentLink2URL: https://jlcpcb.com/partdetail/C525512; ComponentLink3Description: LCSC Part URL; ComponentLink3URL: https://lcsc.com/product-detail/Multilayer-Ceramic-Capacitors-MLCC---SMD-SMT_Walsin-Tech-Corp-Walsin-Tech-Corp-RF18N1R0A500CT_C525512.html
footprint CAP-0603 (0603 (1608M) Capacitor)
pins: 1, 2

## RF18N1R0C500CT
designator C?  Capacitance: 1pF  (hidden comment: *)
Capacitor, Ceramic (MLCC), 1pF, 50V, NP0, SMD 0603; Manufacturer: Walsin Tech Corp; Manufacturer Part Number: RF18N1R0C500CT; Package Size: 0603; JLCPCB Basic Part: No; JLCPCB Part Number: C458974; Supplier 1: LCSC; Category: Capacitors - MLCC; Supplier Part Number 1: C458974; Voltage Rating: 50V; Temperature Coefficient: NP0; RoHS: Yes; ComponentLink1Description: Datasheet; ComponentLink1URL: https://wmsc.lcsc.com/wmsc/upload/file/pdf/v2/lcsc/2304140030_Walsin-Tech-Corp-RF18N1R0C500CT_C458974.pdf; ComponentLink2Description: JLCPCB Part URL; ComponentLink2URL: https://jlcpcb.com/partdetail/C458974; ComponentLink3Description: LCSC Part URL; ComponentLink3URL: https://lcsc.com/product-detail/Multilayer-Ceramic-Capacitors-MLCC---SMD-SMT_Walsin-Tech-Corp-Walsin-Tech-Corp-RF18N1R0C500CT_C458974.html
footprint CAP-0603 (0603 (1608M) Capacitor)
pins: 1, 2

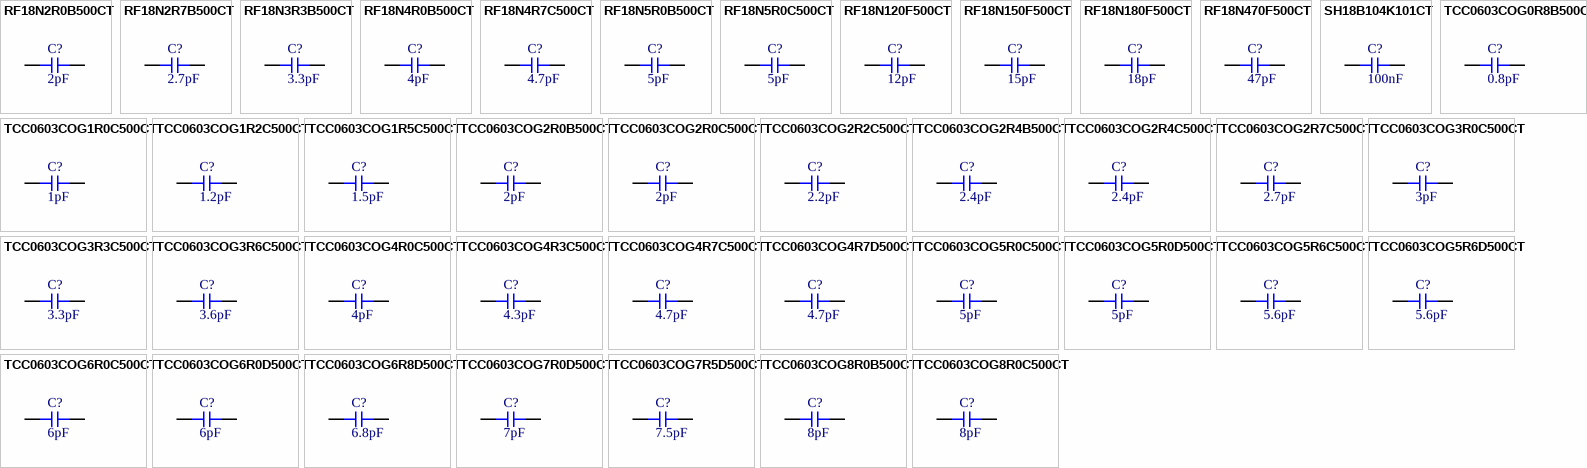
[diagram p84: symbols RF18N2R0B500CT to TCC0603COG8R0C500CT]

## RF18N2R0B500CT
designator C?  Capacitance: 2pF  (hidden comment: *)
Capacitor, Ceramic (MLCC), 2pF, 50V, NP0, SMD 0603; Manufacturer: Walsin Tech Corp; Manufacturer Part Number: RF18N2R0B500CT; Package Size: 0603; JLCPCB Basic Part: No; JLCPCB Part Number: C2909448; Supplier 1: LCSC; Category: Capacitors - MLCC; Supplier Part Number 1: C2909448; Voltage Rating: 50V; Temperature Coefficient: NP0; RoHS: Yes; ComponentLink1Description: Datasheet; ComponentLink1URL: https://wmsc.lcsc.com/wmsc/upload/file/pdf/v2/lcsc/2110281730_Walsin-Tech-Corp-RF18N2R0B500CT_C2909448.pdf; ComponentLink2Description: JLCPCB Part URL; ComponentLink2URL: https://jlcpcb.com/partdetail/C2909448; ComponentLink3Description: LCSC Part URL; ComponentLink3URL: https://lcsc.com/product-detail/Multilayer-Ceramic-Capacitors-MLCC---SMD-SMT_Walsin-Tech-Corp-Walsin-Tech-Corp-RF18N2R0B500CT_C2909448.html
footprint CAP-0603 (0603 (1608M) Capacitor)
pins: 1, 2

## RF18N2R7B500CT
designator C?  Capacitance: 2.7pF  (hidden comment: *)
Capacitor, Ceramic (MLCC), 2.7pF, 50V, NP0, SMD 0603; Manufacturer: Walsin Tech Corp; Manufacturer Part Number: RF18N2R7B500CT; Package Size: 0603; JLCPCB Basic Part: No; JLCPCB Part Number: C384667; Supplier 1: LCSC; Category: Capacitors - MLCC; Supplier Part Number 1: C384667; Voltage Rating: 50V; Temperature Coefficient: NP0; RoHS: Yes; ComponentLink1Description: Datasheet; ComponentLink1URL: https://wmsc.lcsc.com/wmsc/upload/file/pdf/v2/lcsc/2304140030_Walsin-Tech-Corp-RF18N2R7B500CT_C384667.pdf; ComponentLink2Description: JLCPCB Part URL; ComponentLink2URL: https://jlcpcb.com/partdetail/C384667; ComponentLink3Description: LCSC Part URL; ComponentLink3URL: https://lcsc.com/product-detail/Multilayer-Ceramic-Capacitors-MLCC---SMD-SMT_Walsin-Tech-Corp-Walsin-Tech-Corp-RF18N2R7B500CT_C384667.html
footprint CAP-0603 (0603 (1608M) Capacitor)
pins: 1, 2

## RF18N3R3B500CT
designator C?  Capacitance: 3.3pF  (hidden comment: *)
Capacitor, Ceramic (MLCC), 3.3pF, 50V, NP0, SMD 0603; Manufacturer: Walsin Tech Corp; Manufacturer Part Number: RF18N3R3B500CT; Package Size: 0603; JLCPCB Basic Part: No; JLCPCB Part Number: C2909455; Supplier 1: LCSC; Category: Capacitors - MLCC; Supplier Part Number 1: C2909455; Voltage Rating: 50V; Temperature Coefficient: NP0; RoHS: Yes; ComponentLink1Description: Datasheet; ComponentLink1URL: https://wmsc.lcsc.com/wmsc/upload/file/pdf/v2/lcsc/2110281730_Walsin-Tech-Corp-RF18N3R3B500CT_C2909455.pdf; ComponentLink2Description: JLCPCB Part URL; ComponentLink2URL: https://jlcpcb.com/partdetail/C2909455; ComponentLink3Description: LCSC Part URL; ComponentLink3URL: https://lcsc.com/product-detail/Multilayer-Ceramic-Capacitors-MLCC---SMD-SMT_Walsin-Tech-Corp-Walsin-Tech-Corp-RF18N3R3B500CT_C2909455.html
footprint CAP-0603 (0603 (1608M) Capacitor)
pins: 1, 2

## RF18N4R0B500CT
designator C?  Capacitance: 4pF  (hidden comment: *)
Capacitor, Ceramic (MLCC), 4pF, 50V, NP0, SMD 0603; Manufacturer: Walsin Tech Corp; Manufacturer Part Number: RF18N4R0B500CT; Package Size: 0603; JLCPCB Basic Part: No; JLCPCB Part Number: C2909467; Supplier 1: LCSC; Category: Capacitors - MLCC; Supplier Part Number 1: C2909467; Voltage Rating: 50V; Temperature Coefficient: NP0; RoHS: Yes; ComponentLink1Description: Datasheet; ComponentLink1URL: https://wmsc.lcsc.com/wmsc/upload/file/pdf/v2/lcsc/2110281730_Walsin-Tech-Corp-RF18N4R0B500CT_C2909467.pdf; ComponentLink2Description: JLCPCB Part URL; ComponentLink2URL: https://jlcpcb.com/partdetail/C2909467; ComponentLink3Description: LCSC Part URL; ComponentLink3URL: https://lcsc.com/product-detail/Multilayer-Ceramic-Capacitors-MLCC---SMD-SMT_Walsin-Tech-Corp-Walsin-Tech-Corp-RF18N4R0B500CT_C2909467.html
footprint CAP-0603 (0603 (1608M) Capacitor)
pins: 1, 2

## RF18N4R7C500CT
designator C?  Capacitance: 4.7pF  (hidden comment: *)
Capacitor, Ceramic (MLCC), 4.7pF, 50V, NP0, SMD 0603; Manufacturer: Walsin Tech Corp; Manufacturer Part Number: RF18N4R7C500CT; Package Size: 0603; JLCPCB Basic Part: No; JLCPCB Part Number: C458975; Supplier 1: LCSC; Category: Capacitors - MLCC; Supplier Part Number 1: C458975; Voltage Rating: 50V; Temperature Coefficient: NP0; RoHS: Yes; ComponentLink1Description: Datasheet; ComponentLink1URL: https://wmsc.lcsc.com/wmsc/upload/file/pdf/v2/lcsc/2304140030_Walsin-Tech-Corp-RF18N4R7C500CT_C458975.pdf; ComponentLink2Description: JLCPCB Part URL; ComponentLink2URL: https://jlcpcb.com/partdetail/C458975; ComponentLink3Description: LCSC Part URL; ComponentLink3URL: https://lcsc.com/product-detail/Multilayer-Ceramic-Capacitors-MLCC---SMD-SMT_Walsin-Tech-Corp-Walsin-Tech-Corp-RF18N4R7C500CT_C458975.html
footprint CAP-0603 (0603 (1608M) Capacitor)
pins: 1, 2

## RF18N5R0B500CT
designator C?  Capacitance: 5pF  (hidden comment: *)
Capacitor, Ceramic (MLCC), 5pF, 50V, NP0, SMD 0603; Manufacturer: Walsin Tech Corp; Manufacturer Part Number: RF18N5R0B500CT; Package Size: 0603; JLCPCB Basic Part: No; JLCPCB Part Number: C2909470; Supplier 1: LCSC; Category: Capacitors - MLCC; Supplier Part Number 1: C2909470; Voltage Rating: 50V; Temperature Coefficient: NP0; RoHS: Yes; ComponentLink1Description: Datasheet; ComponentLink1URL: https://wmsc.lcsc.com/wmsc/upload/file/pdf/v2/lcsc/2110281730_Walsin-Tech-Corp-RF18N5R0B500CT_C2909470.pdf; ComponentLink2Description: JLCPCB Part URL; ComponentLink2URL: https://jlcpcb.com/partdetail/C2909470; ComponentLink3Description: LCSC Part URL; ComponentLink3URL: https://lcsc.com/product-detail/Multilayer-Ceramic-Capacitors-MLCC---SMD-SMT_Walsin-Tech-Corp-Walsin-Tech-Corp-RF18N5R0B500CT_C2909470.html
footprint CAP-0603 (0603 (1608M) Capacitor)
pins: 1, 2

## RF18N5R0C500CT
designator C?  Capacitance: 5pF  (hidden comment: *)
Capacitor, Ceramic (MLCC), 5pF, 50V, NP0, SMD 0603; Manufacturer: Walsin Tech Corp; Manufacturer Part Number: RF18N5R0C500CT; Package Size: 0603; JLCPCB Basic Part: No; JLCPCB Part Number: C458976; Supplier 1: LCSC; Category: Capacitors - MLCC; Supplier Part Number 1: C458976; Voltage Rating: 50V; Temperature Coefficient: NP0; RoHS: Yes; ComponentLink1Description: Datasheet; ComponentLink1URL: https://wmsc.lcsc.com/wmsc/upload/file/pdf/v2/lcsc/2304140030_Walsin-Tech-Corp-RF18N5R0C500CT_C458976.pdf; ComponentLink2Description: JLCPCB Part URL; ComponentLink2URL: https://jlcpcb.com/partdetail/C458976; ComponentLink3Description: LCSC Part URL; ComponentLink3URL: https://lcsc.com/product-detail/Multilayer-Ceramic-Capacitors-MLCC---SMD-SMT_Walsin-Tech-Corp-Walsin-Tech-Corp-RF18N5R0C500CT_C458976.html
footprint CAP-0603 (0603 (1608M) Capacitor)
pins: 1, 2

## RF18N120F500CT
designator C?  Capacitance: 12pF  (hidden comment: *)
Capacitor, Ceramic (MLCC), 12pF, ±1%, 50V, NP0, ±1%, SMD 0603; Manufacturer: Walsin Tech Corp; Manufacturer Part Number: RF18N120F500CT; Package Size: 0603; JLCPCB Basic Part: No; JLCPCB Part Number: C2909428; Supplier 1: LCSC; Category: Capacitors - MLCC; Supplier Part Number 1: C2909428; Tolerance: ±1%; Voltage Rating: 50V; Temperature Coefficient: NP0; RoHS: Yes; ComponentLink1Description: Datasheet; ComponentLink1URL: https://wmsc.lcsc.com/wmsc/upload/file/pdf/v2/lcsc/2110281730_Walsin-Tech-Corp-RF18N120F500CT_C2909428.pdf; ComponentLink2Description: JLCPCB Part URL; ComponentLink2URL: https://jlcpcb.com/partdetail/C2909428; ComponentLink3Description: LCSC Part URL; ComponentLink3URL: https://lcsc.com/product-detail/Multilayer-Ceramic-Capacitors-MLCC---SMD-SMT_Walsin-Tech-Corp-Walsin-Tech-Corp-RF18N120F500CT_C2909428.html
footprint CAP-0603 (0603 (1608M) Capacitor)
pins: 1, 2

## RF18N150F500CT
designator C?  Capacitance: 15pF  (hidden comment: *)
Capacitor, Ceramic (MLCC), 15pF, ±1%, 50V, NP0, ±1%, SMD 0603; Manufacturer: Walsin Tech Corp; Manufacturer Part Number: RF18N150F500CT; Package Size: 0603; JLCPCB Basic Part: No; JLCPCB Part Number: C2909430; Supplier 1: LCSC; Category: Capacitors - MLCC; Supplier Part Number 1: C2909430; Tolerance: ±1%; Voltage Rating: 50V; Temperature Coefficient: NP0; RoHS: Yes; ComponentLink1Description: Datasheet; ComponentLink1URL: https://wmsc.lcsc.com/wmsc/upload/file/pdf/v2/lcsc/2110281730_Walsin-Tech-Corp-RF18N150F500CT_C2909430.pdf; ComponentLink2Description: JLCPCB Part URL; ComponentLink2URL: https://jlcpcb.com/partdetail/C2909430; ComponentLink3Description: LCSC Part URL; ComponentLink3URL: https://lcsc.com/product-detail/Multilayer-Ceramic-Capacitors-MLCC---SMD-SMT_Walsin-Tech-Corp-Walsin-Tech-Corp-RF18N150F500CT_C2909430.html
footprint CAP-0603 (0603 (1608M) Capacitor)
pins: 1, 2
